# Altium footprint library CONNECTORS.PcbLib: 55 footprints (part 4 of 4)
Each footprint in its own frame and in the unit in brackets; x right, y up, seen from the top. Pads: shape width x height; smd on the part's side, far side on the other; paste and mask are expansions set on the pad; w line width, h text height; cw(c..) or ccw(c..) is an arc to the next point about the centre after c.
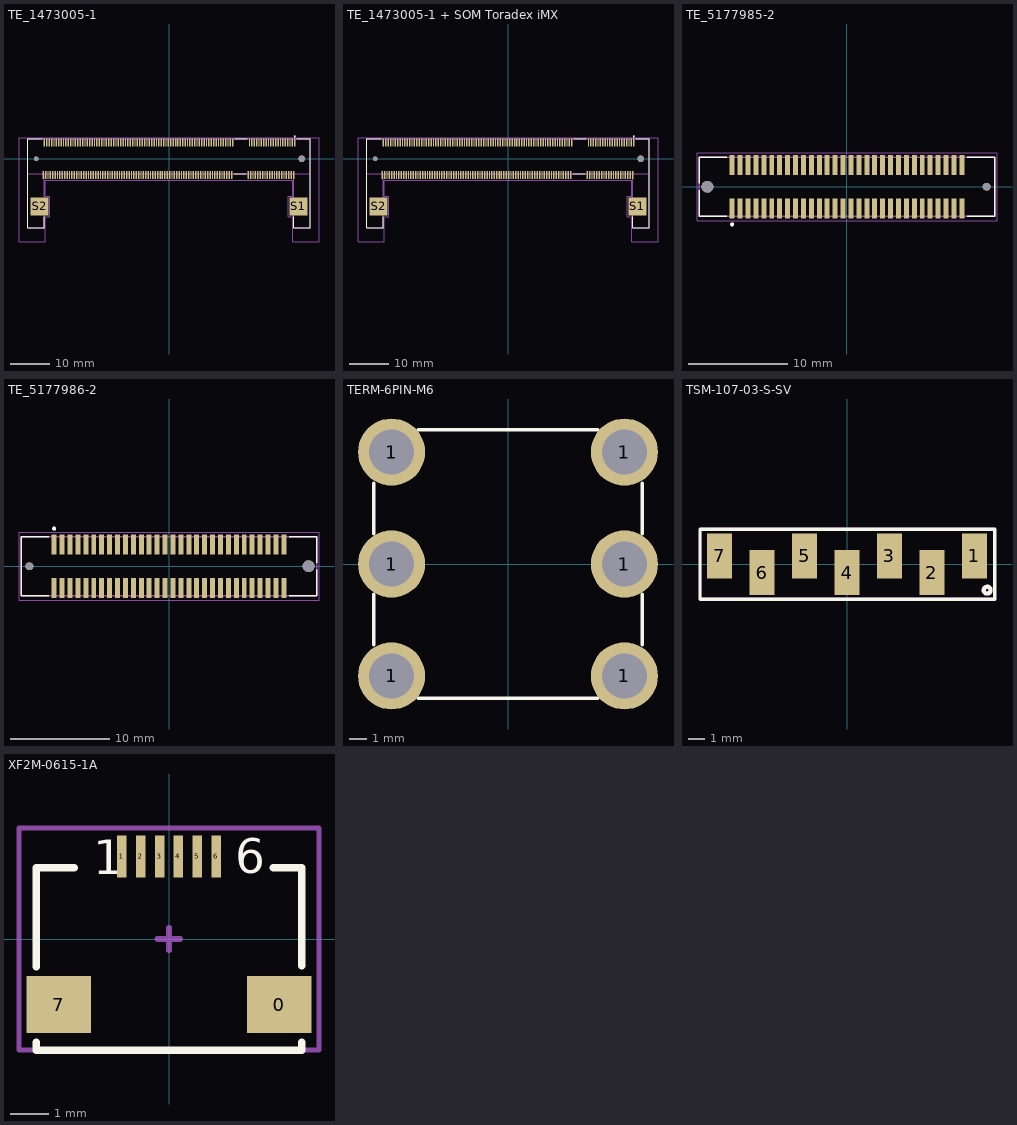
[diagram p3: the footprints below, top view; thin cyan lines are the x and y axes]

## TE_1473005-1 [mm]
height 5.9
pads (204):
  rect 0.35x2 smd: 1(31.65,4.1) 2(31.35,-4.1) 3(31.05,4.1) 4(30.75,-4.1) 5(30.45,4.1) 6(30.15,-4.1) 7(29.85,4.1) 8(29.55,-4.1) 9(29.25,4.1) 10(28.95,-4.1) 11(28.65,4.1) 12(28.35,-4.1) 13(28.05,4.1) 14(27.75,-4.1) 15(27.45,4.1) 16(27.15,-4.1) 17(26.85,4.1) 18(26.55,-4.1) 19(26.25,4.1) 20(25.95,-4.1) 21(25.65,4.1) 22(25.35,-4.1) 23(25.05,4.1) 24(24.75,-4.1) 25(24.45,4.1) 26(24.15,-4.1) 27(23.85,4.1) 28(23.55,-4.1) 29(23.25,4.1) 30(22.95,-4.1) 31(22.65,4.1) 32(22.35,-4.1) 33(22.05,4.1) 34(21.75,-4.1) 35(21.45,4.1) 36(21.15,-4.1) 37(20.85,4.1) 38(20.55,-4.1) 39(20.25,4.1) 40(19.95,-4.1) 41(16.05,4.1) 42(15.75,-4.1) 43(15.45,4.1) 44(15.15,-4.1) 45(14.85,4.1) 46(14.55,-4.1) 47(14.25,4.1) 48(13.95,-4.1) 49(13.65,4.1) 50(13.35,-4.1) 51(13.05,4.1) 52(12.75,-4.1) 53(12.45,4.1) 54(12.15,-4.1) 55(11.85,4.1) 56(11.55,-4.1) 57(11.25,4.1) 58(10.95,-4.1) 59(10.65,4.1) 60(10.35,-4.1) 61(10.05,4.1) 62(9.75,-4.1) 63(9.45,4.1) 64(9.15,-4.1) 65(8.85,4.1) 66(8.55,-4.1) 67(8.25,4.1) 68(7.95,-4.1) 69(7.65,4.1) 70(7.35,-4.1) 71(7.05,4.1) 72(6.75,-4.1) 73(6.45,4.1) 74(6.15,-4.1) 75(5.85,4.1) 76(5.55,-4.1) 77(5.25,4.1) 78(4.95,-4.1) 79(4.65,4.1) 80(4.35,-4.1) 81(4.05,4.1) 82(3.75,-4.1) 83(3.45,4.1) 84(3.15,-4.1) 85(2.85,4.1) 86(2.55,-4.1) 87(2.25,4.1) 88(1.95,-4.1) 89(1.65,4.1) 90(1.35,-4.1) 91(1.05,4.1) 92(0.75,-4.1) 93(0.45,4.1) 94(0.15,-4.1) 95(-0.15,4.1) 96(-0.45,-4.1) 97(-0.75,4.1) 98(-1.05,-4.1) 99(-1.35,4.1) 100(-1.65,-4.1) 101(-1.95,4.1) 102(-2.25,-4.1) 103(-2.55,4.1) 104(-2.85,-4.1) 105(-3.15,4.1) 106(-3.45,-4.1) 107(-3.75,4.1) 108(-4.05,-4.1) 109(-4.35,4.1) 110(-4.65,-4.1) 111(-4.95,4.1) 112(-5.25,-4.1) 113(-5.55,4.1) 114(-5.85,-4.1) 115(-6.15,4.1) 116(-6.45,-4.1) 117(-6.75,4.1) 118(-7.05,-4.1) 119(-7.35,4.1) 120(-7.65,-4.1) 121(-7.95,4.1) 122(-8.25,-4.1) 123(-8.55,4.1) 124(-8.85,-4.1) 125(-9.15,4.1) 126(-9.45,-4.1) 127(-9.75,4.1) 128(-10.05,-4.1) 129(-10.35,4.1) 130(-10.65,-4.1) 131(-10.95,4.1) 132(-11.25,-4.1) 133(-11.55,4.1) 134(-11.85,-4.1) 135(-12.15,4.1) 136(-12.45,-4.1) 137(-12.75,4.1) 138(-13.05,-4.1) 139(-13.35,4.1) 140(-13.65,-4.1) 141(-13.95,4.1) 142(-14.25,-4.1) 143(-14.55,4.1) 144(-14.85,-4.1) 145(-15.15,4.1) 146(-15.45,-4.1) 147(-15.75,4.1) 148(-16.05,-4.1) 149(-16.35,4.1) 150(-16.65,-4.1) 151(-16.95,4.1) 152(-17.25,-4.1) 153(-17.55,4.1) 154(-17.85,-4.1) 155(-18.15,4.1) 156(-18.45,-4.1) 157(-18.75,4.1) 158(-19.05,-4.1) 159(-19.35,4.1) 160(-19.65,-4.1) 161(-19.95,4.1) 162(-20.25,-4.1) 163(-20.55,4.1) 164(-20.85,-4.1) 165(-21.15,4.1) 166(-21.45,-4.1) 167(-21.75,4.1) 168(-22.05,-4.1) 169(-22.35,4.1) 170(-22.65,-4.1) 171(-22.95,4.1) 172(-23.25,-4.1) 173(-23.55,4.1) 174(-23.85,-4.1) 175(-24.15,4.1) 176(-24.45,-4.1) 177(-24.75,4.1) 178(-25.05,-4.1) 179(-25.35,4.1) 180(-25.65,-4.1) 181(-25.95,4.1) 182(-26.25,-4.1) 183(-26.55,4.1) 184(-26.85,-4.1) 185(-27.15,4.1) 186(-27.45,-4.1) 187(-27.75,4.1) 188(-28.05,-4.1) 189(-28.35,4.1) 190(-28.65,-4.1) 191(-28.95,4.1) 192(-29.25,-4.1) 193(-29.55,4.1) 194(-29.85,-4.1) 195(-30.15,4.1) 196(-30.45,-4.1) 197(-30.75,4.1) 198(-31.05,-4.1) 199(-31.35,4.1) 200(-31.65,-4.1)
  rect 4.5x4.6 smd: S1(32.55,-12) S2(-32.55,-12)
  round 1.2 hole 1.2 unplated: ""(-33.4,0)
  round 1.7 hole 1.7 unplated: ""(33.4,0)
Top Overlay:
  circle w0.2: c31.65,5.6 r0.1
  lines w0.127: -31.85,5 -35.55,5 -35.55,-17.3 -31.45,-17.3 -31.45,-14.62 ; 16.25,-3.7 19.45,-3.7 ; 16.55,5 19.75,5 ; 31.45,-14.62 31.45,-17.3 35.55,-17.3 35.55,5 32.15,5
Mechanical 13:
  circle w0.2: c31.65,5.6 r0.1
  lines w0.127: -35.55,-3.7 -35.55,5 35.55,5 35.55,-3.7 ; -35.55,-3.7 -31.45,-3.7 ; -35.55,-3.7 -35.55,-17.3 -31.45,-17.3 -31.45,-3.7 ; -31.45,-3.7 31.45,-3.7 ; 31.45,-3.7 35.55,-3.7 ; 31.45,-3.7 31.45,-17.3 35.55,-17.3 35.55,-3.7
Mechanical 15:
  lines w0.05: -37.75,-20.9 -31.2,-20.9 -31.2,-14.55 -30.05,-14.55 -30.05,-9.45 -31.2,-9.45 -31.2,-5.35 31.2,-5.35 31.2,-9.45 30.05,-9.45 30.05,-14.55 31.2,-14.55 31.2,-20.9 37.75,-20.9 37.75,5.35 -37.75,5.35 -37.75,-20.9
3D body "c-1473005-1-j1-3d.stp": height 5.24, standoff -0.66, extent -35.75,-21.075 35.75,4.975

## TE_1473005-1 + SOM Toradex iMX [mm]
height 5.9
pads (204):
  rect 0.35x2 smd: 1(31.65,4.1) 2(31.35,-4.1) 3(31.05,4.1) 4(30.75,-4.1) 5(30.45,4.1) 6(30.15,-4.1) 7(29.85,4.1) 8(29.55,-4.1) 9(29.25,4.1) 10(28.95,-4.1) 11(28.65,4.1) 12(28.35,-4.1) 13(28.05,4.1) 14(27.75,-4.1) 15(27.45,4.1) 16(27.15,-4.1) 17(26.85,4.1) 18(26.55,-4.1) 19(26.25,4.1) 20(25.95,-4.1) 21(25.65,4.1) 22(25.35,-4.1) 23(25.05,4.1) 24(24.75,-4.1) 25(24.45,4.1) 26(24.15,-4.1) 27(23.85,4.1) 28(23.55,-4.1) 29(23.25,4.1) 30(22.95,-4.1) 31(22.65,4.1) 32(22.35,-4.1) 33(22.05,4.1) 34(21.75,-4.1) 35(21.45,4.1) 36(21.15,-4.1) 37(20.85,4.1) 38(20.55,-4.1) 39(20.25,4.1) 40(19.95,-4.1) 41(16.05,4.1) 42(15.75,-4.1) 43(15.45,4.1) 44(15.15,-4.1) 45(14.85,4.1) 46(14.55,-4.1) 47(14.25,4.1) 48(13.95,-4.1) 49(13.65,4.1) 50(13.35,-4.1) 51(13.05,4.1) 52(12.75,-4.1) 53(12.45,4.1) 54(12.15,-4.1) 55(11.85,4.1) 56(11.55,-4.1) 57(11.25,4.1) 58(10.95,-4.1) 59(10.65,4.1) 60(10.35,-4.1) 61(10.05,4.1) 62(9.75,-4.1) 63(9.45,4.1) 64(9.15,-4.1) 65(8.85,4.1) 66(8.55,-4.1) 67(8.25,4.1) 68(7.95,-4.1) 69(7.65,4.1) 70(7.35,-4.1) 71(7.05,4.1) 72(6.75,-4.1) 73(6.45,4.1) 74(6.15,-4.1) 75(5.85,4.1) 76(5.55,-4.1) 77(5.25,4.1) 78(4.95,-4.1) 79(4.65,4.1) 80(4.35,-4.1) 81(4.05,4.1) 82(3.75,-4.1) 83(3.45,4.1) 84(3.15,-4.1) 85(2.85,4.1) 86(2.55,-4.1) 87(2.25,4.1) 88(1.95,-4.1) 89(1.65,4.1) 90(1.35,-4.1) 91(1.05,4.1) 92(0.75,-4.1) 93(0.45,4.1) 94(0.15,-4.1) 95(-0.15,4.1) 96(-0.45,-4.1) 97(-0.75,4.1) 98(-1.05,-4.1) 99(-1.35,4.1) 100(-1.65,-4.1) 101(-1.95,4.1) 102(-2.25,-4.1) 103(-2.55,4.1) 104(-2.85,-4.1) 105(-3.15,4.1) 106(-3.45,-4.1) 107(-3.75,4.1) 108(-4.05,-4.1) 109(-4.35,4.1) 110(-4.65,-4.1) 111(-4.95,4.1) 112(-5.25,-4.1) 113(-5.55,4.1) 114(-5.85,-4.1) 115(-6.15,4.1) 116(-6.45,-4.1) 117(-6.75,4.1) 118(-7.05,-4.1) 119(-7.35,4.1) 120(-7.65,-4.1) 121(-7.95,4.1) 122(-8.25,-4.1) 123(-8.55,4.1) 124(-8.85,-4.1) 125(-9.15,4.1) 126(-9.45,-4.1) 127(-9.75,4.1) 128(-10.05,-4.1) 129(-10.35,4.1) 130(-10.65,-4.1) 131(-10.95,4.1) 132(-11.25,-4.1) 133(-11.55,4.1) 134(-11.85,-4.1) 135(-12.15,4.1) 136(-12.45,-4.1) 137(-12.75,4.1) 138(-13.05,-4.1) 139(-13.35,4.1) 140(-13.65,-4.1) 141(-13.95,4.1) 142(-14.25,-4.1) 143(-14.55,4.1) 144(-14.85,-4.1) 145(-15.15,4.1) 146(-15.45,-4.1) 147(-15.75,4.1) 148(-16.05,-4.1) 149(-16.35,4.1) 150(-16.65,-4.1) 151(-16.95,4.1) 152(-17.25,-4.1) 153(-17.55,4.1) 154(-17.85,-4.1) 155(-18.15,4.1) 156(-18.45,-4.1) 157(-18.75,4.1) 158(-19.05,-4.1) 159(-19.35,4.1) 160(-19.65,-4.1) 161(-19.95,4.1) 162(-20.25,-4.1) 163(-20.55,4.1) 164(-20.85,-4.1) 165(-21.15,4.1) 166(-21.45,-4.1) 167(-21.75,4.1) 168(-22.05,-4.1) 169(-22.35,4.1) 170(-22.65,-4.1) 171(-22.95,4.1) 172(-23.25,-4.1) 173(-23.55,4.1) 174(-23.85,-4.1) 175(-24.15,4.1) 176(-24.45,-4.1) 177(-24.75,4.1) 178(-25.05,-4.1) 179(-25.35,4.1) 180(-25.65,-4.1) 181(-25.95,4.1) 182(-26.25,-4.1) 183(-26.55,4.1) 184(-26.85,-4.1) 185(-27.15,4.1) 186(-27.45,-4.1) 187(-27.75,4.1) 188(-28.05,-4.1) 189(-28.35,4.1) 190(-28.65,-4.1) 191(-28.95,4.1) 192(-29.25,-4.1) 193(-29.55,4.1) 194(-29.85,-4.1) 195(-30.15,4.1) 196(-30.45,-4.1) 197(-30.75,4.1) 198(-31.05,-4.1) 199(-31.35,4.1) 200(-31.65,-4.1)
  rect 4.5x4.6 smd: S1(32.55,-12) S2(-32.55,-12)
  round 1.2 hole 1.2 unplated: ""(-33.4,0)
  round 1.7 hole 1.7 unplated: ""(33.4,0)
Top Overlay:
  circle w0.2: c31.65,5.6 r0.1
  lines w0.127: -31.85,5 -35.55,5 -35.55,-17.3 -31.45,-17.3 -31.45,-14.62 ; 16.25,-3.7 19.45,-3.7 ; 16.55,5 19.75,5 ; 31.45,-14.62 31.45,-17.3 35.55,-17.3 35.55,5 32.15,5
Mechanical 13:
  circle w0.2: c31.65,5.6 r0.1
  lines w0.127: -35.55,-3.7 -35.55,-17.3 -31.45,-17.3 -31.45,-3.7 ; -35.55,-3.7 -31.45,-3.7 ; -35.55,-3.7 -35.55,5 35.55,5 35.55,-3.7 ; -31.45,-3.7 31.45,-3.7 ; 31.45,-3.7 31.45,-17.3 35.55,-17.3 35.55,-3.7 ; 31.45,-3.7 35.55,-3.7
Mechanical 15:
  lines w0.05: -37.75,-20.9 -37.75,5.35 37.75,5.35 37.75,-20.9 31.2,-20.9 31.2,-14.55 30.05,-14.55 30.05,-9.45 31.2,-9.45 31.2,-5.35 -31.2,-5.35 -31.2,-9.45 -30.05,-9.45 -30.05,-14.55 -31.2,-14.55 -31.2,-20.9 -37.75,-20.9
3D body "c-1473005-1-j1-3d.stp": height 5.24, standoff -0.66, extent -35.75,-21.075 35.75,4.975
3D body "Colibri_iMX6ULL_v1.1_3D_STEP_model.step": height 5.62, standoff 1.1, extent -33.789,-36.7 33.81,0

## TE_5177985-2 [mm]
pads (62):
  rect 0.5x2 smd: 1(-11.6,-2.2) 2(-11.6,2.2) 3(-10.8,-2.2) 4(-10.8,2.2) 5(-10,-2.2) 6(-10,2.2) 7(-9.2,-2.2) 8(-9.2,2.2) 9(-8.4,-2.2) 10(-8.4,2.2) 11(-7.6,-2.2) 12(-7.6,2.2) 13(-6.8,-2.2) 14(-6.8,2.2) 15(-6,-2.2) 16(-6,2.2) 17(-5.2,-2.2) 18(-5.2,2.2) 19(-4.4,-2.2) 20(-4.4,2.2) 21(-3.6,-2.2) 22(-3.6,2.2) 23(-2.8,-2.2) 24(-2.8,2.2) 25(-2,-2.2) 26(-2,2.2) 27(-1.2,-2.2) 28(-1.2,2.2) 29(-0.4,-2.2) 30(-0.4,2.2) 31(0.4,-2.2) 32(0.4,2.2) 33(1.2,-2.2) 34(1.2,2.2) 35(2,-2.2) 36(2,2.2) 37(2.8,-2.2) 38(2.8,2.2) 39(3.6,-2.2) 40(3.6,2.2) 41(4.4,-2.2) 42(4.4,2.2) 43(5.2,-2.2) 44(5.2,2.2) 45(6,-2.2) 46(6,2.2) 47(6.8,-2.2) 48(6.8,2.2) 49(7.6,-2.2) 50(7.6,2.2) 51(8.4,-2.2) 52(8.4,2.2) 53(9.2,-2.2) 54(9.2,2.2) 55(10,-2.2) 56(10,2.2) 57(10.8,-2.2) 58(10.8,2.2) 59(11.6,-2.2) 60(11.6,2.2)
  round 1.2 hole 1.2 unplated: ""(-14.1,0)
  round 0.8 hole 0.8 unplated: ""(14.1,0)
Top Overlay:
  circle w0.2: c-11.6,-3.8 r0.1
  lines w0.127: -14.9,-0.36 -14.9,-3 -12.17,-3 ; -14.9,0.36 -14.9,3 -12.17,3 ; 12.17,-3 14.9,-3 14.9,3 12.17,3
Mechanical 13:
  circle w0.2: c-11.6,-3.8 r0.1
  lines w0.127: -14.9,-3 14.9,-3 14.9,3 -14.9,3 -14.9,-3
Mechanical 15:
  lines w0.05: -15.15,-3.45 15.15,-3.45 15.15,3.45 -15.15,3.45 -15.15,-3.45
3D body "5177985-2.stp": height 3.75, standoff -0.5, extent -14.9,-3 14.9,3

## TE_5177986-2 [mm]
pads (62):
  rect 0.5x2 smd: 1(-11.6,2.2) 2(-11.6,-2.2) 3(-10.8,2.2) 4(-10.8,-2.2) 5(-10,2.2) 6(-10,-2.2) 7(-9.2,2.2) 8(-9.2,-2.2) 9(-8.4,2.2) 10(-8.4,-2.2) 11(-7.6,2.2) 12(-7.6,-2.2) 13(-6.8,2.2) 14(-6.8,-2.2) 15(-6,2.2) 16(-6,-2.2) 17(-5.2,2.2) 18(-5.2,-2.2) 19(-4.4,2.2) 20(-4.4,-2.2) 21(-3.6,2.2) 22(-3.6,-2.2) 23(-2.8,2.2) 24(-2.8,-2.2) 25(-2,2.2) 26(-2,-2.2) 27(-1.2,2.2) 28(-1.2,-2.2) 29(-0.4,2.2) 30(-0.4,-2.2) 31(0.4,2.2) 32(0.4,-2.2) 33(1.2,2.2) 34(1.2,-2.2) 35(2,2.2) 36(2,-2.2) 37(2.8,2.2) 38(2.8,-2.2) 39(3.6,2.2) 40(3.6,-2.2) 41(4.4,2.2) 42(4.4,-2.2) 43(5.2,2.2) 44(5.2,-2.2) 45(6,2.2) 46(6,-2.2) 47(6.8,2.2) 48(6.8,-2.2) 49(7.6,2.2) 50(7.6,-2.2) 51(8.4,2.2) 52(8.4,-2.2) 53(9.2,2.2) 54(9.2,-2.2) 55(10,2.2) 56(10,-2.2) 57(10.8,2.2) 58(10.8,-2.2) 59(11.6,2.2) 60(11.6,-2.2)
  round 0.8 hole 0.8 unplated: ""(-14.1,0)
  round 1.2 hole 1.2 unplated: ""(14.1,0)
Top Overlay:
  circle w0.2: c-11.6,3.8 r0.1
  lines w0.127: -12.17,-3 -14.9,-3 -14.9,3 -12.17,3 ; 12.17,-3 14.9,-3 14.9,-0.36 ; 12.17,3 14.9,3 14.9,0.36
Mechanical 13:
  circle w0.2: c-11.6,3.8 r0.1
  lines w0.127: -14.9,-3 14.9,-3 14.9,3 -14.9,3 -14.9,-3
Mechanical 15:
  lines w0.05: -15.15,-3.45 15.15,-3.45 15.15,3.45 -15.15,3.45 -15.15,-3.45
3D body "5177986-2.stp": height 4.6, standoff -0.5, extent -14.9,-3 14.9,3

## TERM-6PIN-M6 [mm]
pads (6):
  round 3.75 hole 2.5: 1(-6.5,-6.25) 1(-6.5,0) 1(-6.5,6.25) 1(6.5,-6.25) 1(6.5,0) 1(6.5,6.25)
Top Overlay:
  lines w0.2: -7.5,-4.5 -7.5,-1.7 ; -7.5,1.7 -7.5,4.5 ; -5,-7.5 5,-7.5 ; -5,7.5 5,7.5 ; 7.5,-4.5 7.5,-1.7 ; 7.5,1.7 7.5,4.5
3D body "TERM-6PIN-M6.step": height 8.05, standoff -3.95, extent -7.262,-7.25 7.238,7.25

## TSM-107-03-S-SV [mm] "1 ROW, 7 POSITION, 0.100 PITCH, PLUG SMT"
height 14.5
pads (7):
  rect 1.5x2.7 smd: 1(7.62,0.5) 2(5.08,-0.5) 3(2.54,0.5) 4(0,-0.5) 5(-2.54,0.5) 6(-5.08,-0.5) 7(-7.62,0.5)
Top Overlay:
  circle w0.254: c8.382,-1.549 r0.205
  lines w0.2: -8.788,2.083 -8.771,2.1 8.839,2.1 8.839,-2.1 -8.788,-2.1 -8.788,2.1
Top Assembly:
  lines w0.127: -8.771,-2.057 8.839,-2.057 8.839,2.134 -8.771,2.134 -8.771,-2.057
  text ".Designator" at -6.731,-0.406 h1.27
3D body: height 2.5, standoff 0, extent -8.788,-1.168 8.839,1.321
3D body: height 0.3, standoff 0, extent -2.997,1.321 -2.108,1.727
3D body: height 0.3, standoff 0, extent -5.537,-1.575 -4.648,-1.168
3D body: height 0.3, standoff 0, extent -8.077,1.321 -7.188,1.727
3D body: height 0.3, standoff 0, extent -0.457,-1.575 0.432,-1.168
3D body: height 0.3, standoff 0, extent 2.096,1.321 2.985,1.727
3D body: height 0.3, standoff 0, extent 4.623,-1.575 5.512,-1.168
3D body: height 14.5, standoff 2.5, extent -5.499,-0.394 -4.61,0.394
3D body: height 14.5, standoff 2.5, extent -8.09,-0.394 -7.201,0.394
3D body: height 14.5, standoff 2.5, extent -2.984,-0.394 -2.095,0.394
3D body: height 14.5, standoff 2.5, extent -0.444,-0.394 0.445,0.394
3D body: height 14.5, standoff 2.5, extent 2.096,-0.394 2.985,0.394
3D body: height 14.5, standoff 2.5, extent 4.636,-0.394 5.525,0.394
3D body: height 14.5, standoff 2.5, extent 7.176,-0.394 8.065,0.394

## XF2M-0615-1A [mm]
pads (8):
  rect 1.7x1.5 smd: 0(2.9,-1.725) 7(-2.9,-1.725)
  rect 0.25x1.1 smd: 1(-1.25,2.175) 2(-0.75,2.175) 3(-0.25,2.175) 4(0.25,2.175) 5(0.75,2.175) 6(1.25,2.175)
Top Overlay:
  lines w0.2: -3.5,-2.721 -3.5,-2.925 3.5,-2.925 3.5,-2.721 ; -3.5,-0.729 -3.5,1.875 -2.5,1.875 ; 2.75,1.875 3.5,1.875 3.5,-0.704
  text "6" at 1.75,1.725 h0.9
  text "1" at -2,1.7 h0.9
Top Assembly:
  lines w0.127: -3.95,-2.925 -3.95,2.925 3.95,2.925 3.95,-2.925 -3.95,-2.925
Top Component Center:
  lines w0.15: -0.302,0 0.298,0 ; -0.002,-0.3 -0.002,0.3
3D body "XF2M-0615-1A.stp": height 2, standoff 0, extent -3.55,-2.7 3.55,3.2